# Altium footprint library CADTcommon.PcbLib: 503 footprints (part 9 of 32)
Each footprint in its own frame and in the unit in brackets; x right, y up, seen from the top. Pads: shape width x height; smd on the part's side, far side on the other; paste and mask are expansions set on the pad; w line width, h text height; cw(c..) or ccw(c..) is an arc to the next point about the centre after c.
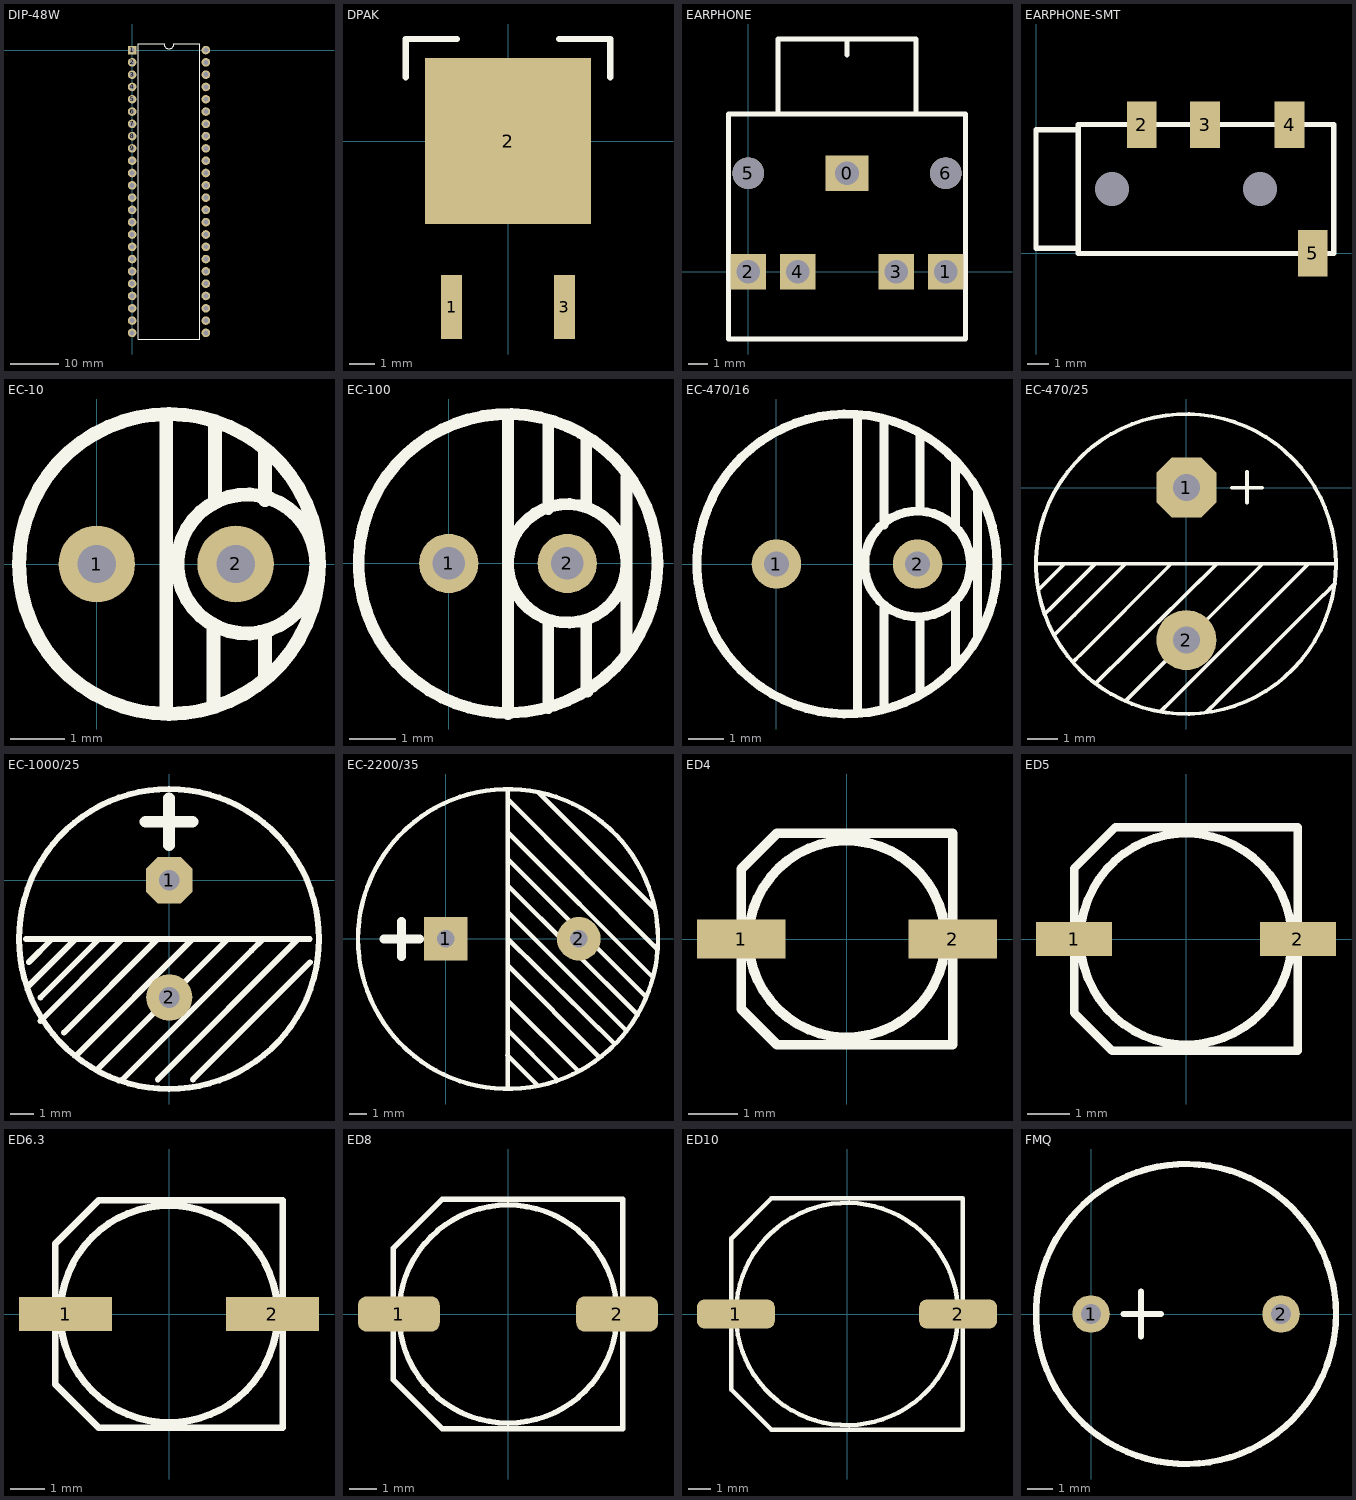
[diagram p8: the footprints below, top view; thin cyan lines are the x and y axes]

## DIP-48W [mil]
pads (48):
  rect 70x70 hole 40: 1(0,0)
  round 70 hole 40: 2(0,-100) 3(0,-200) 4(0,-300) 5(0,-400) 6(0,-500) 7(0,-600) 8(0,-700) 9(0,-800) 10(0,-900) 11(0,-1000) 12(0,-1100) 13(0,-1200) 14(0,-1300) 15(0,-1400) 16(0,-1500) 17(0,-1600) 18(0,-1700) 19(0,-1800) 20(0,-1900) 21(0,-2000) 22(0,-2100) 23(0,-2200) 24(0,-2300) 25(600,-2300) 26(600,-2200) 27(600,-2100) 28(600,-2000) 29(600,-1900) 30(600,-1800) 31(600,-1700) 32(600,-1600) 33(600,-1500) 34(600,-1400) 35(600,-1300) 36(600,-1200) 37(600,-1100) 38(600,-1000) 39(600,-900) 40(600,-800) 41(600,-700) 42(600,-600) 43(600,-500) 44(600,-400) 45(600,-300) 46(600,-200) 47(600,-100) 48(600,0)
Top Overlay:
  lines w10: 50,-2350 550,-2350 550,50 340,50 cw(c300,50) 260,50 50,50 50,-2350

## DPAK [mil]
pads (3):
  rect 33x100 smd: 1(-88.5,-260) 3(88.5,-260)
  rect 260x260 smd: 2(0,0)
Top Overlay:
  lines w10: -160,100 -160,160 -80,160 ; 80,160 160,160 160,100

## EARPHONE [mm]
pads (7):
  rect 2.2x1.8 hole 1.2: 0(5,5)
  rect 1.8x1.8 hole 1.2: 1(10,0) 2(0,0) 3(7.5,0) 4(2.5,0)
  round 1.6 hole 1.6 unplated: 5(0,5) 6(10,5)
Top Overlay:
  lines w0.254: 1.5,8 1.5,11.8 8.4,11.8 ; 5,11 5,11.8 ; 8.5,8 8.5,11.8 ; -1,-3.4 -1,8 11,8 11,-3.4 -1,-3.4
3D body: height 3.2, standoff -10.8, extent -1.041,-3.689 11.059,11.411

## EARPHONE-SMT [mm]
pads (6):
  rect 1.4x2.2 smd: 2(4.988,6.101) 3(7.988,6.101) 4(11.988,6.101) 5(13.088,0.001)
  round 1 hole 1.6: ""(3.588,3.051) ""(10.588,3.051)
Top Overlay:
  lines w0.254: 1.988,0.251 -0.012,0.251 -0.012,5.851 1.988,5.851 ; 1.988,0.251 1.988,5.851 ; 1.988,0.251 1.988,0.001 14.088,0.001 14.088,6.101 1.988,6.101 1.988,5.851
3D body: height 4.06, standoff -0.01, extent 0.822,-0.406 12.792,6.928

## EC-10 [mm]
pads (2):
  round 1.4 hole 0.7: 1(0,0) 2(2.54,0)
Top Overlay:
  circle w0.254: c2.743,0 r1.27
  circle w0.254: c1.321,0 r2.743
  lines w0.254: 1.27,-2.7 1.27,2.667 ; 2.134,-2.54 2.134,-1.219 ; 2.159,1.194 2.159,2.565 ; 3.073,-2.032 3.073,-1.33 ; 3.073,1.168 3.073,2.032
3D body: height 11.53, standoff -3.27, extent -1.23,-2.515 3.821,2.536

## EC-100 [mm]
pads (2):
  round 1.27 hole 0.7: 1(0,0) 2(2.54,0)
Top Overlay:
  circle w0.254: c1.27,0 r3.2
  circle w0.254: c2.54,0 r1.27
  lines w0.254: 1.27,-3.226 1.27,3.175 ; 2.134,-3.099 2.134,-1.245 ; 2.134,1.168 2.134,3.023 ; 2.946,-1.245 2.946,-2.718 2.972,-2.743 ; 2.946,1.219 2.946,2.667 ; 3.81,-1.88 3.81,1.854
3D body: height 13.03, standoff -3.01, extent -1.981,-3.099 4.37,3.252

## EC-470/16 [mm]
pads (2):
  round 1.4 hole 0.7: 1(0,0) 2(4,0)
Top Overlay:
  circle w0.254: c2,0 r4.25
  circle w0.254: c4,0 r1.5
  lines w0.254: 2.3,-4.2 2.3,4.2 ; 3.048,-4.1 3.048,-1.2 ; 3.048,1.1 3.048,4.1 ; 4.064,-3.7 4.064,-1.524 ; 4.064,1.524 4.064,3.7 ; 5.08,-2.9 5.08,-1.016 ; 5.08,1.016 5.08,2.9 ; 5.7,-2.032 5.7,2.032
3D body: height 12, standoff -19, extent -2.269,-4.191 6.231,4.309

## EC-470/25 [mm]
pads (2):
  oct 2x2 hole 0.9: 1(0,0)
  round 2 hole 0.9: 2(0,-5.08)
Top Overlay:
  circle w0.127: c-0.013,-2.546 r5
  lines w0.127: -5,-2.546 4.886,-2.537 ; -4.928,-3.404 -4.063,-2.539 -4.059,-2.539 ; -4.724,-4.216 -4.571,-4.063 -4.567,-4.063 -3.05,-2.546 ; -4.394,-4.902 -3.738,-4.246 -3.734,-4.246 ; -4.059,-4.571 -2.027,-2.539 ; -3.759,-5.791 -3.555,-5.587 -3.551,-5.587 -0.503,-2.539 ; -3,-6.5 1.021,-2.539 ; -2.027,-7.111 2.545,-2.539 ; -0.864,-7.468 -0.507,-7.111 -0.503,-7.111 3.561,-3.047 4.069,-2.539 ; 0.686,-7.468 1.018,-7.135 1.018,-7.127 4.574,-3.571 4.583,-3.571 4.953,-3.2 ; 1.511,-0.006 2.527,-0.006 ; 2.019,-0.505 2.019,0.519
3D body: height 16.53, standoff -3.74, extent -5.051,-7.62 5,2.431

## EC-1000/25 [mm]
pads (2):
  oct 2x2 hole 0.9: 1(0,0)
  round 2 hole 0.9: 2(0,-5.08)
Top Overlay:
  circle w0.254: c-0.013,-2.546 r6.5
  lines w0.254: -6.213,-2.546 6.088,-2.546 ; -6.091,-4.571 -4.059,-2.539 ; -6.091,-3.555 -5.082,-2.546 -5.075,-2.546 ; -5.583,-6.095 -2.027,-2.539 ; -5.583,-5.079 -3.05,-2.546 -3.043,-2.546 ; -4.567,-6.603 -0.503,-2.539 ; -4.059,-7.619 1.021,-2.539 ; -3.043,-8.127 2.545,-2.539 ; -2.027,-8.635 3.561,-3.047 4.069,-2.539 ; -0.503,-8.635 5.593,-2.539 ; 1.021,-8.635 6.101,-3.555
  lines w0.508: -1.029,2.534 1.003,2.534 ; -0.013,1.518 -0.013,3.55
3D body: height 25.4, standoff -28.75, extent -6.647,-9.169 6.553,4.031

## EC-2200/35 [mm]
pads (2):
  rect 2.5x2.5 hole 1: 1(0,0)
  round 2.5 hole 1: 2(7.62,0)
Top Overlay:
  circle w0.254: c3.562,-0.013 r8.6
  lines w0.254: 3.531,-6.68 5.25,-8.4 ; 3.555,-8.58 3.555,8.55 ; 3.555,-5.583 3.555,-5.075 ; 3.555,-3.551 7.6,-7.6 ; 3.555,-1.519 8.8,-6.8 ; 3.555,0.005 9.65,-6 ; 3.555,2.037 3.555,1.529 10.36,-5.28 ; 3.555,3.053 11,-4.36 ; 3.555,4.577 11.5,-3.35 ; 3.555,6.101 11.87,-2.22 ; 3.556,8.001 12.152,-0.635 ; 3.581,-5.258 6.4,-8.1 ; 5.3,8.4 11.98,1.721
  lines w0.508: -3.55,-0.013 -1.518,-0.013 ; -2.534,-1.029 -2.534,1.003
3D body: height 16, standoff -1.5, extent -5.241,-8.966 12.759,9.034

## ED4 [mm]
height 5.5
pads (2):
  rect 1.8x0.8 smd: 1(-2.15,0) 2(2.15,0)
Top Overlay:
  circle w0.2: c0,0 r2
  lines w0.2: -1.433,-2.139 -2.15,-1.422 ; -1.433,2.139 -2.15,1.422 ; -2.15,-1.422 -2.15,1.422 ; -2.15,-1.422 -1.422,-2.15 2.15,-2.15 2.15,2.15 -1.422,2.15 -2.15,1.422
3D body: height 5.2, standoff 0, extent -2.286,-2.159 2.314,2.141

## ED5 [mm]
height 5.5
pads (2):
  rect 1.8x0.8 smd: 1(-2.65,0) 2(2.65,0)
Top Overlay:
  circle w0.2: c0,0 r2.5
  lines w0.2: -2.65,-1.744 -1.744,-2.65 2.65,-2.65 2.65,2.65 -1.668,2.65 -2.65,1.668 -2.65,-1.744
3D body: height 5.2, standoff 0, extent -2.8,-2.667 2.8,2.633

## ED6.3 [mm]
height 5.5
pads (2):
  rect 2.7x1 smd: 1(-3,0) 2(3,0)
Top Overlay:
  circle w0.2: c0,0 r3.15
  lines w0.2: -3.3,2.032 -3.3,-2.032 -2.032,-3.3 3.3,-3.3 3.3,3.3 -2.032,3.3 -3.287,2.045
3D body: height 5.2, standoff 0, extent -3.5,-3.302 3.5,3.298

## ED8 [mm]
height 10
pads (2):
  rrect50% 3x1.3 smd: 1(-4,0) 2(4,0)
Top Overlay:
  circle w0.2: c0,0 r4
  lines w0.2: -4.2,-2.413 -2.413,-4.2 4.2,-4.2 4.2,4.2 -2.413,4.2 -4.2,2.413 -4.2,-2.413
3D body: height 10.5, standoff 0, extent -4.521,-4.216 4.479,4.084

## ED10 [mm]
height 10
pads (2):
  rrect50% 3.5x1.3 smd: 1(-5,0) 2(5,0)
Top Overlay:
  circle w0.2: c0,0 r5
  lines w0.2: -5.2,3.404 -5.2,-3.404 -3.404,-5.2 5.2,-5.2 5.2,5.2 -3.404,5.2 -5.191,3.413
3D body: height 10.21, standoff -0.01, extent -5.775,-5.118 5.825,5.182

## FMQ [mm]
pads (2):
  round 1.5 hole 0.8: 1(0,0) 2(7.6,0)
Top Overlay:
  circle w0.254: c3.799,0 r6.001
  lines w0.254: 1.3,0 2.8,0 ; 2,-0.9 2,0.9
3D body: height 9.65, standoff -4.5, extent -5.727,-6 9.727,6